# Altium footprint library Connector.PcbLib: 536 footprints (part 22 of 34)
Each footprint in its own frame and in the unit in brackets; x right, y up, seen from the top. Pads: shape width x height; smd on the part's side, far side on the other; paste and mask are expansions set on the pad; w line width, h text height; cw(c..) or ccw(c..) is an arc to the next point about the centre after c.
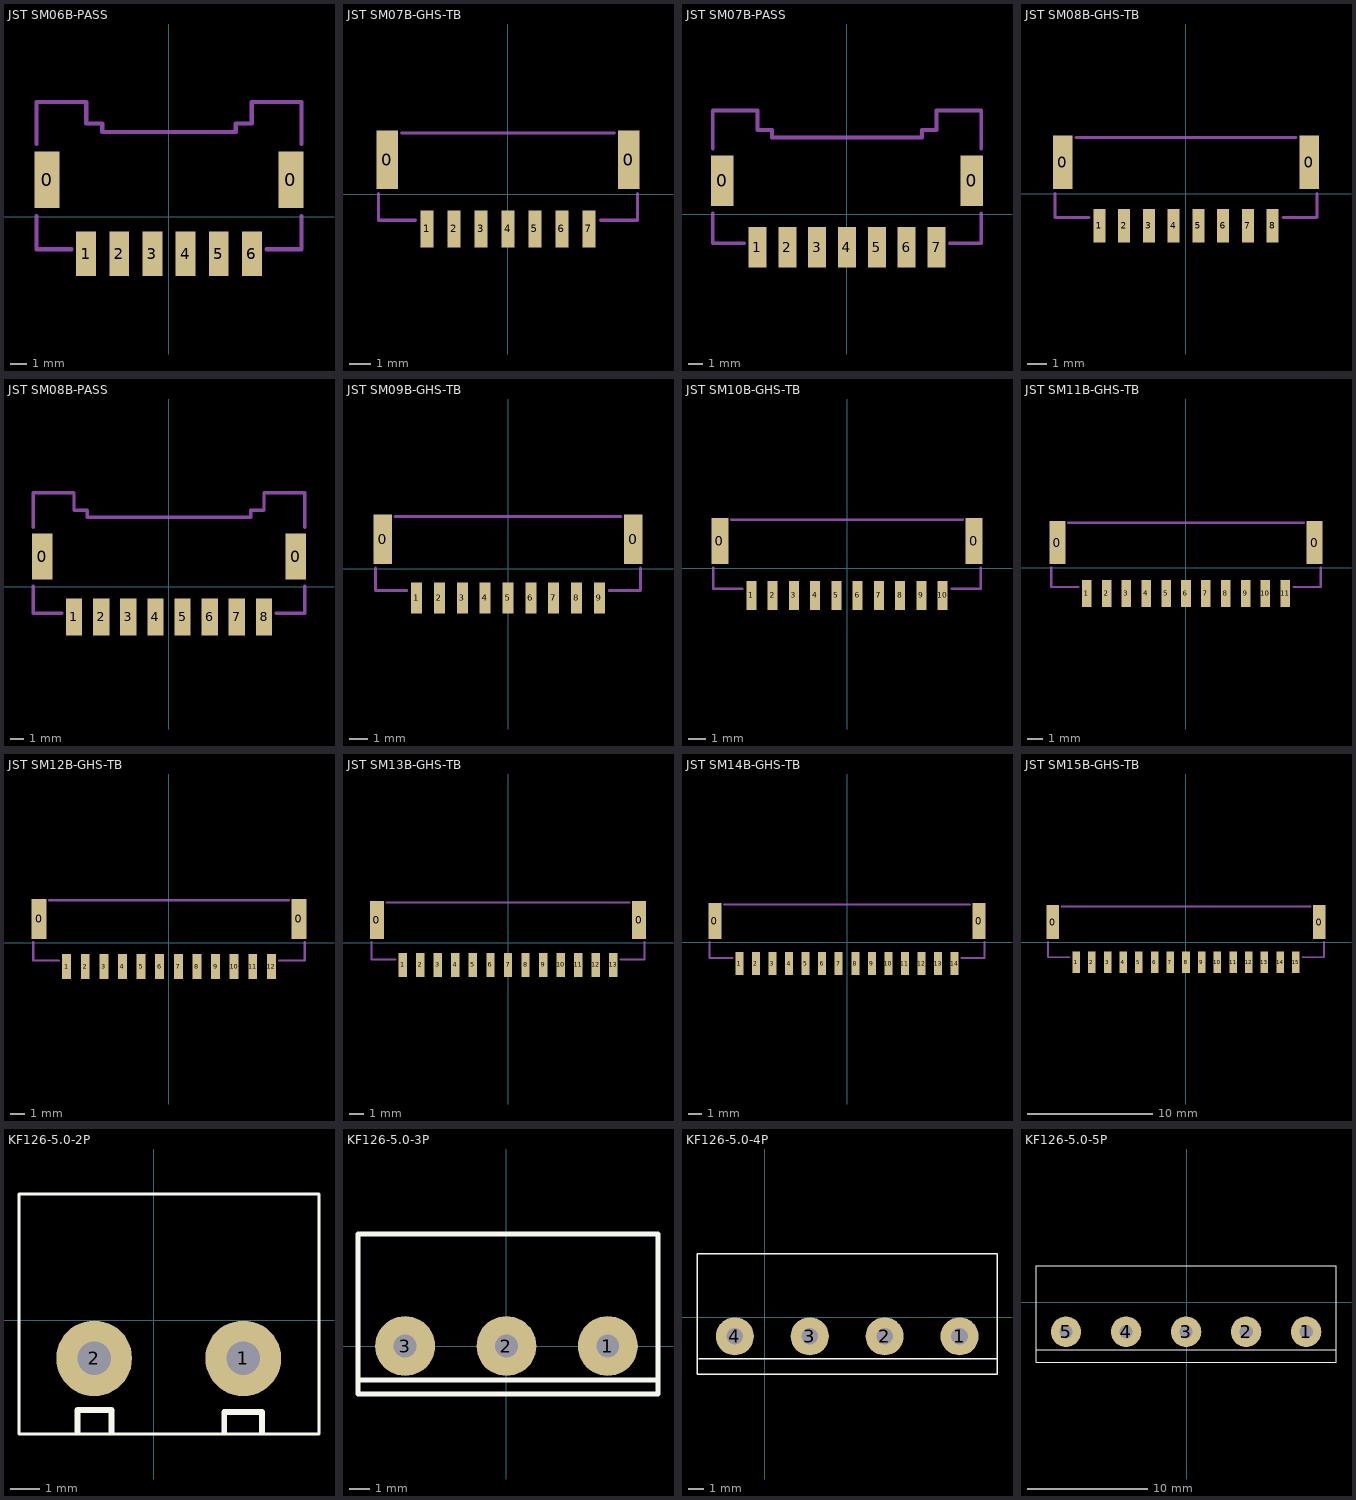
[diagram p21: the footprints below, top view; thin cyan lines are the x and y axes]

## JST SM06B-PASS [mm]
pads (8):
  rect 1.5x3.4 smd: 0(-7.35,2.225) 0(7.35,2.225)
  rect 1.2x2.7 smd: 1(-5,-2.225) 2(-3,-2.225) 3(-1,-2.225) 4(1,-2.225) 5(3,-2.225) 6(5,-2.225)
Mechanical 15:
  lines w0.254: -7.994,0.042 -7.994,-1.965 -5.886,-1.965 ; -7.994,4.385 -7.994,6.925 ; -7.994,6.919 -7.989,6.925 -4.997,6.925 -4.997,5.63 -4.032,5.63 -4.032,5.122 4.032,5.122 4.032,5.63 4.997,5.63 4.997,6.925 7.994,6.925 7.994,4.385 ; 5.886,-1.965 7.994,-1.965 7.994,0.042
3D body "SM06B-PASS-TB.STEP": height 5.8, standoff 0, extent -7.994,-3.075 8.006,6.925

## JST SM07B-GHS-TB [mm]
pads (9):
  rect 1x2.7 smd: 0(-5.6,1.6) 0(5.6,1.6)
  rect 0.6x1.7 smd: 1(-3.75,-1.6) 2(-2.5,-1.6) 3(-1.25,-1.6) 4(0,-1.6) 5(1.25,-1.6) 6(2.5,-1.6) 7(3.75,-1.6)
Mechanical 15:
  lines w0.15: -6,0.031 -6,-1.2 -4.283,-1.2 ; -4.925,2.85 -1.325,2.85 ; -3.675,2.85 -0.075,2.85 ; -2.425,2.85 1.175,2.85 ; -1.175,2.85 2.425,2.85 ; 0.075,2.85 3.675,2.85 ; 1.325,2.85 4.925,2.85 ; 4.283,-1.2 6,-1.2 6,0.031
3D body "SM07B-GHS-TB.STEP": height 4.35, standoff 0, extent -6,-2 6,2.85

## JST SM07B-PASS [mm]
pads (9):
  rect 1.5x3.4 smd: 0(-8.35,2.225) 0(8.35,2.225)
  rect 1.2x2.7 smd: 1(-6,-2.225) 2(-4,-2.225) 3(-2,-2.225) 4(0,-2.225) 5(2,-2.225) 6(4,-2.225) 7(6,-2.225)
Mechanical 15:
  lines w0.254: -8.994,0.042 -8.994,-1.965 -6.886,-1.965 ; -8.994,4.385 -8.994,6.925 -5.997,6.925 -5.997,5.63 -5.032,5.63 -5.032,5.122 5.032,5.122 5.032,5.63 5.997,5.63 5.997,6.925 8.994,6.925 8.994,4.385 ; 6.886,-1.965 8.994,-1.965 8.994,0.042
3D body "SM07B-PASS-TB.STEP": height 5.8, standoff 0, extent -8.994,-3.075 9.006,6.925

## JST SM08B-GHS-TB [mm]
pads (10):
  rect 1x2.7 smd: 0(-6.225,1.6) 0(6.225,1.6)
  rect 0.6x1.7 smd: 1(-4.375,-1.6) 2(-3.125,-1.6) 3(-1.875,-1.6) 4(-0.625,-1.6) 5(0.625,-1.6) 6(1.875,-1.6) 7(3.125,-1.6) 8(4.375,-1.6)
Mechanical 15:
  lines w0.15: -6.625,0.031 -6.625,-1.2 -4.908,-1.2 ; -5.55,2.85 -1.95,2.85 ; -4.3,2.85 -0.7,2.85 ; -3.05,2.85 0.55,2.85 ; -1.8,2.85 1.8,2.85 ; -0.55,2.85 3.05,2.85 ; 0.7,2.85 4.3,2.85 ; 1.95,2.85 5.55,2.85 ; 4.908,-1.2 6.625,-1.2 6.625,0.031
3D body "SM08B-GHS-TB.STEP": height 4.35, standoff 0, extent -6.625,-2 6.625,2.85

## JST SM08B-PASS [mm]
pads (10):
  rect 1.5x3.4 smd: 0(-9.35,2.225) 0(9.35,2.225)
  rect 1.2x2.7 smd: 1(-7,-2.225) 2(-5,-2.225) 3(-3,-2.225) 4(-1,-2.225) 5(1,-2.225) 6(3,-2.225) 7(5,-2.225) 8(7,-2.225)
Mechanical 15:
  lines w0.254: -10,6.919 -9.994,6.925 ; -9.994,0.042 -9.994,-1.965 -7.886,-1.965 ; -9.994,4.385 -9.994,6.925 ; 7.886,-1.965 9.994,-1.965 9.994,0.042 ; 9.994,4.385 9.994,6.925 ; 10,6.919 9.994,6.925 ; -9.994,6.925 -6.997,6.925 -6.997,5.63 -6.032,5.63 -6.032,5.122 6.032,5.122 6.032,5.63 6.997,5.63 6.997,6.925 9.994,6.925
3D body "SM08B-PASS-TB.STEP": height 5.8, standoff 0, extent -10,-3.061 10,6.939

## JST SM09B-GHS-TB [mm]
pads (11):
  rect 1x2.7 smd: 0(-6.85,1.6) 0(6.85,1.6)
  rect 0.6x1.7 smd: 1(-5,-1.6) 2(-3.75,-1.6) 3(-2.5,-1.6) 4(-1.25,-1.6) 5(0,-1.6) 6(1.25,-1.6) 7(2.5,-1.6) 8(3.75,-1.6) 9(5,-1.6)
Mechanical 15:
  lines w0.15: -7.25,0.031 -7.25,-1.2 -5.533,-1.2 ; -6.175,2.85 -2.575,2.85 ; -4.925,2.85 -1.325,2.85 ; -3.675,2.85 -0.075,2.85 ; -2.425,2.85 1.175,2.85 ; -1.175,2.85 2.425,2.85 ; 0.075,2.85 3.675,2.85 ; 1.325,2.85 4.925,2.85 ; 2.575,2.85 6.175,2.85 ; 5.533,-1.2 7.25,-1.2 7.25,0.031
3D body "SM09B-GHS-TB.STEP": height 4.35, standoff 0, extent -7.25,-2 7.25,2.85

## JST SM10B-GHS-TB [mm]
pads (12):
  rect 1x2.7 smd: 0(-7.475,1.6) 0(7.475,1.6)
  rect 0.6x1.7 smd: 1(-5.625,-1.6) 2(-4.375,-1.6) 3(-3.125,-1.6) 4(-1.875,-1.6) 5(-0.625,-1.6) 6(0.625,-1.6) 7(1.875,-1.6) 8(3.125,-1.6) 9(4.375,-1.6) 10(5.625,-1.6)
Mechanical 15:
  lines w0.15: -7.875,0.031 -7.875,-1.2 -6.158,-1.2 ; -6.8,2.85 -3.2,2.85 ; -5.55,2.85 -1.95,2.85 ; -4.3,2.85 -0.7,2.85 ; -3.05,2.85 0.55,2.85 ; -1.8,2.85 1.8,2.85 ; -0.55,2.85 3.05,2.85 ; 0.7,2.85 4.3,2.85 ; 1.95,2.85 5.55,2.85 ; 3.2,2.85 6.8,2.85 ; 6.158,-1.2 7.875,-1.2 7.875,0.031
3D body "SM10B-GHS-TB.STEP": height 4.35, standoff 0, extent -7.875,-2 7.875,2.85

## JST SM11B-GHS-TB [mm]
pads (13):
  rect 1x2.7 smd: 0(-8.1,1.6) 0(8.1,1.6)
  rect 0.6x1.7 smd: 1(-6.25,-1.6) 2(-5,-1.6) 3(-3.75,-1.6) 4(-2.5,-1.6) 5(-1.25,-1.6) 6(0,-1.6) 7(1.25,-1.6) 8(2.5,-1.6) 9(3.75,-1.6) 10(5,-1.6) 11(6.25,-1.6)
Mechanical 15:
  lines w0.15: -8.5,0.031 -8.5,-1.2 -6.783,-1.2 ; -7.425,2.85 -3.825,2.85 ; -6.175,2.85 -2.575,2.85 ; -4.925,2.85 -1.325,2.85 ; -3.675,2.85 -0.075,2.85 ; -2.425,2.85 1.175,2.85 ; -1.175,2.85 2.425,2.85 ; 0.075,2.85 3.675,2.85 ; 1.325,2.85 4.925,2.85 ; 2.575,2.85 6.175,2.85 ; 3.825,2.85 7.425,2.85 ; 6.783,-1.2 8.5,-1.2 8.5,0.031
3D body "SM11B-GHS-TB.STEP": height 4.35, standoff 0, extent -8.5,-2 8.5,2.85

## JST SM12B-GHS-TB [mm]
pads (14):
  rect 1x2.7 smd: 0(-8.725,1.6) 0(8.725,1.6)
  rect 0.6x1.7 smd: 1(-6.875,-1.6) 2(-5.625,-1.6) 3(-4.375,-1.6) 4(-3.125,-1.6) 5(-1.875,-1.6) 6(-0.625,-1.6) 7(0.625,-1.6) 8(1.875,-1.6) 9(3.125,-1.6) 10(4.375,-1.6) 11(5.625,-1.6) 12(6.875,-1.6)
Mechanical 15:
  lines w0.15: -9.125,0.031 -9.125,-1.2 -7.408,-1.2 ; -8.05,2.85 -4.45,2.85 ; -6.8,2.85 -3.2,2.85 ; -5.55,2.85 -1.95,2.85 ; -4.3,2.85 -0.7,2.85 ; -3.05,2.85 0.55,2.85 ; -1.8,2.85 1.8,2.85 ; -0.55,2.85 3.05,2.85 ; 0.7,2.85 4.3,2.85 ; 1.95,2.85 5.55,2.85 ; 3.2,2.85 6.8,2.85 ; 4.45,2.85 8.05,2.85 ; 7.408,-1.2 9.125,-1.2 9.125,0.031
3D body "SM12B-GHS-TB.STEP": height 4.35, standoff 0, extent -9.125,-2 9.125,2.85

## JST SM13B-GHS-TB [mm]
pads (15):
  rect 1x2.7 smd: 0(-9.35,1.6) 0(9.35,1.6)
  rect 0.6x1.7 smd: 1(-7.5,-1.6) 2(-6.25,-1.6) 3(-5,-1.6) 4(-3.75,-1.6) 5(-2.5,-1.6) 6(-1.25,-1.6) 7(0,-1.6) 8(1.25,-1.6) 9(2.5,-1.6) 10(3.75,-1.6) 11(5,-1.6) 12(6.25,-1.6) 13(7.5,-1.6)
Mechanical 15:
  lines w0.15: -9.75,0.031 -9.75,-1.2 -8.033,-1.2 ; -8.675,2.85 -5.075,2.85 ; -7.425,2.85 -3.825,2.85 ; -6.175,2.85 -2.575,2.85 ; -4.925,2.85 -1.325,2.85 ; -3.675,2.85 -0.075,2.85 ; -2.425,2.85 1.175,2.85 ; -1.175,2.85 2.425,2.85 ; 0.075,2.85 3.675,2.85 ; 1.325,2.85 4.925,2.85 ; 2.575,2.85 6.175,2.85 ; 3.825,2.85 7.425,2.85 ; 5.075,2.85 8.675,2.85 ; 8.033,-1.2 9.75,-1.2 9.75,0.031
3D body "SM13B-GHS-TB.STEP": height 4.35, standoff 0, extent -9.75,-2 9.75,2.85

## JST SM14B-GHS-TB [mm]
pads (16):
  rect 1x2.7 smd: 0(-9.975,1.6) 0(9.975,1.6)
  rect 0.6x1.7 smd: 1(-8.125,-1.6) 2(-6.875,-1.6) 3(-5.625,-1.6) 4(-4.375,-1.6) 5(-3.125,-1.6) 6(-1.875,-1.6) 7(-0.625,-1.6) 8(0.625,-1.6) 9(1.875,-1.6) 10(3.125,-1.6) 11(4.375,-1.6) 12(5.625,-1.6) 13(6.875,-1.6) 14(8.125,-1.6)
Mechanical 15:
  lines w0.15: -10.375,0.031 -10.375,-1.2 -8.658,-1.2 ; -9.3,2.85 -5.7,2.85 ; -8.05,2.85 -4.45,2.85 ; -6.8,2.85 -3.2,2.85 ; -5.55,2.85 -1.95,2.85 ; -4.3,2.85 -0.7,2.85 ; -3.05,2.85 0.55,2.85 ; -1.8,2.85 1.8,2.85 ; -0.55,2.85 3.05,2.85 ; 0.7,2.85 4.3,2.85 ; 1.95,2.85 5.55,2.85 ; 3.2,2.85 6.8,2.85 ; 4.45,2.85 8.05,2.85 ; 5.7,2.85 9.3,2.85 ; 8.658,-1.2 10.375,-1.2 10.375,0.031
3D body "SM14B-GHS-TB.STEP": height 4.35, standoff 0, extent -10.375,-2 10.375,2.85

## JST SM15B-GHS-TB [mm]
pads (17):
  rect 1x2.7 smd: 0(-10.6,1.6) 0(10.6,1.6)
  rect 0.6x1.7 smd: 1(-8.75,-1.6) 2(-7.5,-1.6) 3(-6.25,-1.6) 4(-5,-1.6) 5(-3.75,-1.6) 6(-2.5,-1.6) 7(-1.25,-1.6) 8(0,-1.6) 9(1.25,-1.6) 10(2.5,-1.6) 11(3.75,-1.6) 12(5,-1.6) 13(6.25,-1.6) 14(7.5,-1.6) 15(8.75,-1.6)
Mechanical 15:
  lines w0.15: -11,0.031 -11,-1.2 -9.283,-1.2 ; -9.925,2.85 -6.325,2.85 ; -8.675,2.85 -5.075,2.85 ; -7.425,2.85 -3.825,2.85 ; -6.175,2.85 -2.575,2.85 ; -4.925,2.85 -1.325,2.85 ; -3.675,2.85 -0.075,2.85 ; -2.425,2.85 1.175,2.85 ; -1.175,2.85 2.425,2.85 ; 0.075,2.85 3.675,2.85 ; 1.325,2.85 4.925,2.85 ; 2.575,2.85 6.175,2.85 ; 3.825,2.85 7.425,2.85 ; 5.075,2.85 8.675,2.85 ; 6.325,2.85 9.925,2.85 ; 9.283,-1.2 11,-1.2 11,0.031
3D body "SM15B-GHS-TB.STEP": height 4.35, standoff 0, extent -11,-2 11,2.85

## KF126-5.0-2P [mm] "5.0mm"
pads (2):
  round 2.54 hole 1.118: 1(3,-1.27) 2(-2,-1.27)
Top Overlay:
  lines w0.1: -4.521,-3.81 -4.521,4.244 5.539,4.244 5.539,-3.81 -4.521,-3.81
  lines w0.2: -2.565,-3.734 -2.565,-2.997 -1.549,-2.997 -1.422,-2.997 -1.422,-3.734 ; 2.362,-3.759 2.362,-3.073 3.632,-3.073 3.632,-3.759
3D body "050-2.STEP": height 11, standoff -2, extent -4.492,-3.785 5.508,4.215

## KF126-5.0-3P [mm] "5.0mm"
pads (3):
  round 3 hole 1.143: 1(5.08,0) 2(0,0) 3(-5.08,0)
Top Overlay:
  lines w0.25: -7.417,-1.702 7.595,-1.702
  lines w0.254: -7.442,-2.404 -7.442,5.613 7.595,5.613 7.595,-2.404 -7.442,-2.404
3D body "050-3.STEP": height 11, standoff -2, extent -7.398,-2.438 7.602,5.562

## KF126-5.0-4P [mm] "5.0mm"
pads (4):
  round 2.54 hole 1.118: 1(13,-1.27) 2(8,-1.27) 3(3,-1.27) 4(-2,-1.27)
Top Overlay:
  lines w0.1: -4.42,-2.769 15.494,-2.769 ; -4.521,-3.81 15.494,-3.81 15.494,4.244 -4.521,4.244 -4.521,-3.81
3D body "050-2.STEP": height 11, standoff -2, extent 5.5,-3.77 15.5,4.23
3D body "050-2.STEP": height 11, standoff -2, extent -4.492,-3.785 5.508,4.215

## KF126-5.0-5P [mil] "5.0mm"
pads (5):
  round 100 hole 44: 1(390.81,-97) 2(193.96,-97) 3(-2.89,-97) 4(-199.74,-97) 5(-396.59,-97)
Top Overlay:
  lines w3.94: -495,-156 489,-156 ; -495,-197 489,-197 489,120.09 -495,120.09 -495,-197
3D body "050-3.STEP": height 433.07, standoff -78.74, extent -493.12,-195.42 97.43,119.54
3D body "050-2.STEP": height 433.07, standoff -78.74, extent 95.54,-195.42 489.24,119.54